# Altium footprint library General.PcbLib: 128 footprints (part 2 of 8)
Each footprint in its own frame and in the unit in brackets; x right, y up, seen from the top. Pads: shape width x height; smd on the part's side, far side on the other; paste and mask are expansions set on the pad; w line width, h text height; cw(c..) or ccw(c..) is an arc to the next point about the centre after c.
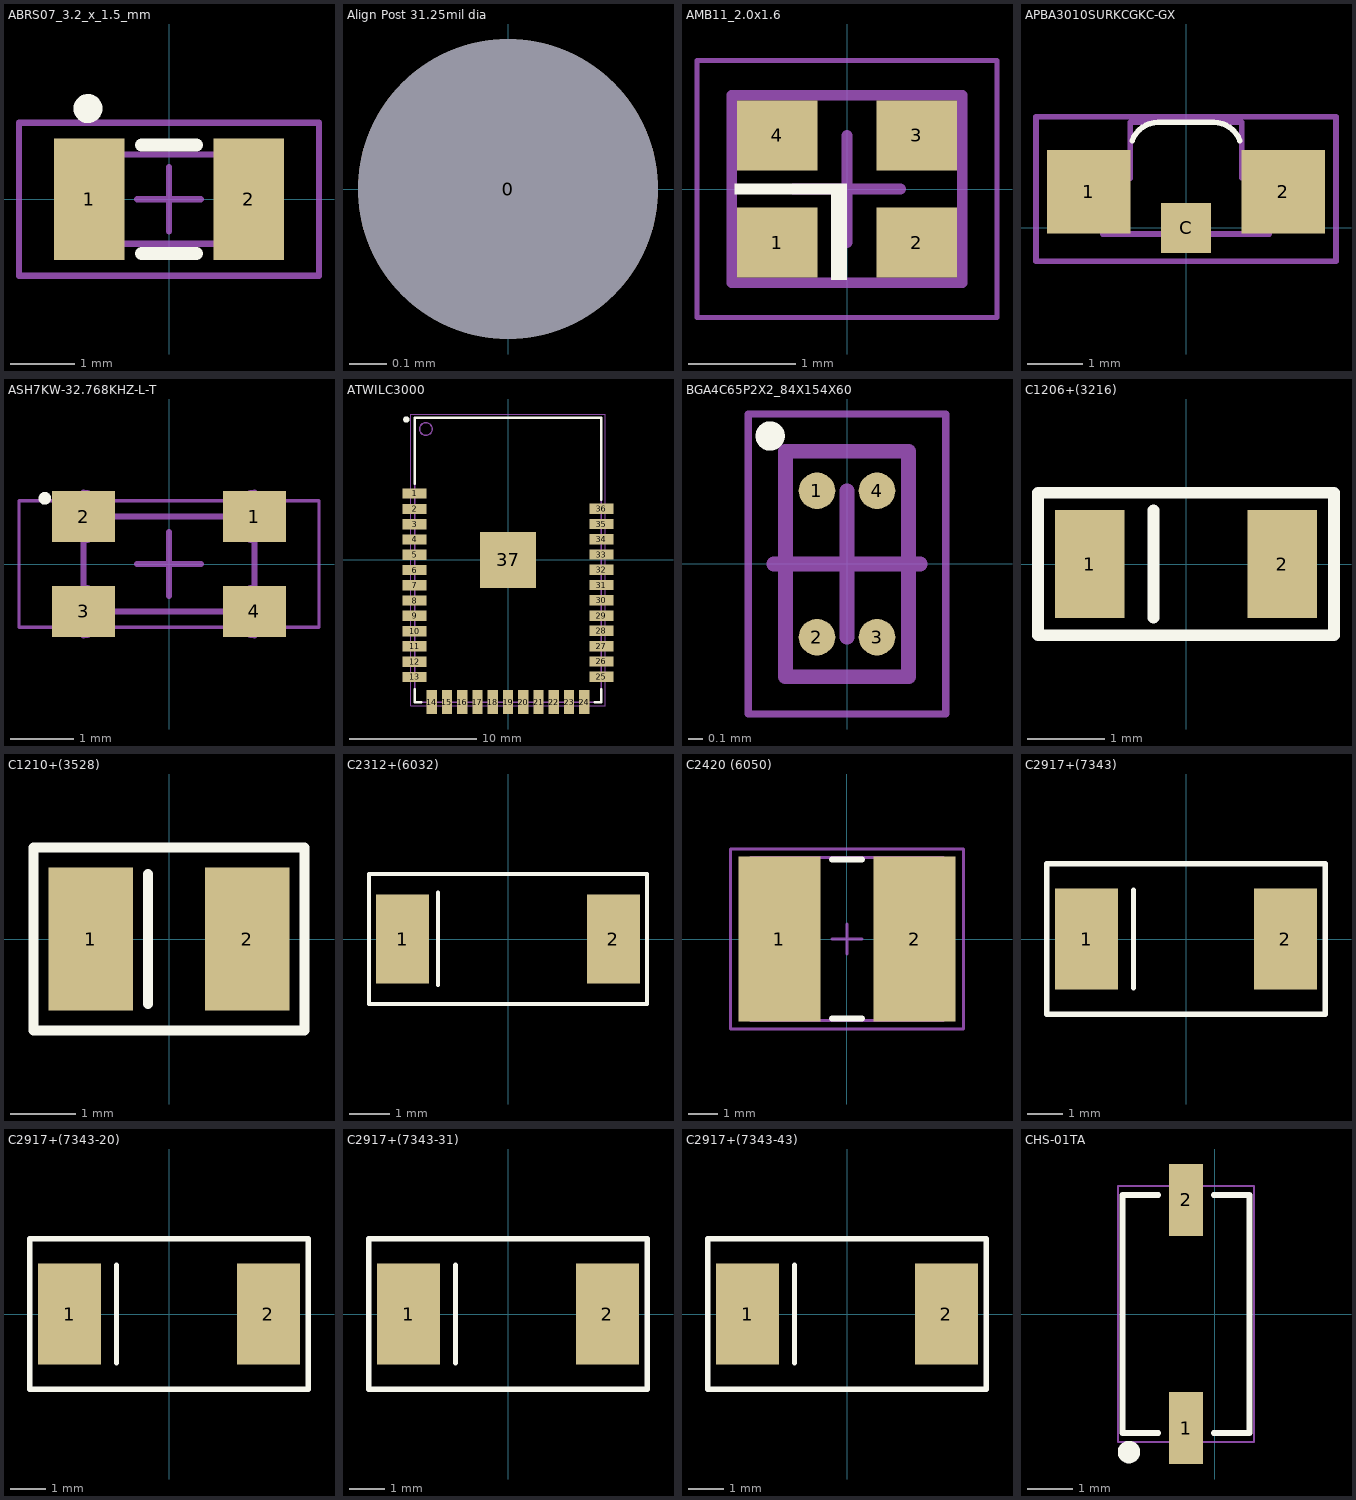
[diagram p1: the footprints below, top view; thin cyan lines are the x and y axes]

## ABRS07_3.2_x_1.5_mm [mm] "Chip Crystal, 2-Leads, Body 3.2x1.3mm, IPC Medium Density"
height 0.9
pads (2):
  rect 1.1x1.9 smd: 1(-1.25,0) 2(1.25,0)
Top Overlay:
  circle w0.254: c-1.269,1.421 r0.1
  lines w0.2: -0.432,-0.851 0.432,-0.851 ; -0.432,0.851 0.432,0.851
Mechanical 13:
  lines w0.1: -1.65,-0.7 1.65,-0.7 1.65,0.7 -1.65,0.7 -1.65,-0.7
Mechanical 15:
  lines w0.1: -0.5,0 0.5,0 ; 0,-0.5 0,0.5 ; -2.35,-1.2 2.35,-1.2 2.35,1.2 -2.35,1.2 -2.35,-1.2
3D body: height 0.9, standoff 0, extent -1.65,-0.7 1.65,0.7

## Align Post 31.25mil dia [mm] "Aignment Post 31.25mil dia."
pads (1):
  round 0.794 hole 0.794 unplated mask+0.102: 0(0,0)
3D body "90145A305_18-8 STAINLESS STEEL DOWEL PIN.STEP": height 0.83, standoff -2.35, extent -0.397,-0.397 0.397,0.397

## AMB11_2.0x1.6 [mm] "QFN, 8-Leads, Body 2.00x1.60mm, Pitch 0.50mm, Thermal Pad 0.15x1.60mm, IPC High Density"
height 0.59
pads (4):
  rect 0.75x0.65 smd: 1(-0.65,-0.5) 2(0.65,-0.5) 3(0.65,0.5) 4(-0.65,0.5)
Top Overlay:
  rectangle: -1.05,-0.05 0,0.05
  rectangle: -0.15,-0.85 0,0
Mechanical 13:
  lines w0.1: -1.075,-0.875 -1.075,0.875 1.075,0.875 1.075,-0.875 -1.075,-0.875
Mechanical 15:
  lines w0.05: -1.4,-1.2 -1.4,1.2 1.4,1.2 1.4,-1.2 -1.4,-1.2
  lines w0.1: -0.5,0 0.5,0 ; 0,-0.5 0,0.5
3D body: height 0.59, standoff 0, extent -1.075,-0.875 1.075,0.875

## APBA3010SURKCGKC-GX [mm] "LED GREEN/RED CLEAR CHIP SMD R/A"
height 1
pads (3):
  rect 1.5x1.5 smd: 1(-1.75,0.65) 2(1.75,0.65)
  rect 0.9x0.9 smd: C(0,0)
Top Overlay:
  lines w0.1: -0.97,1.571 cw(c-0.5,1.4) -0.5,1.9 0.5,1.9 cw(c0.5,1.4) 0.97,1.571
Mechanical 13:
  lines w0.1: -1.5,-0.11 1.5,-0.11 1.5,0.9 1,0.9 1,1.9 -1,1.9 -1,0.895 -1.5,0.895 -1.5,-0.11
Mechanical 15:
  lines w0.1: -2.7,-0.6 -2.7,1.5 -2.7,2 2.7,2 2.7,-0.6 -2.7,-0.6
3D body "APBA3010.STEP": height 1.1, standoff 0.1, extent -1.5,-0.11 1.5,1.9

## ASH7KW-32.768KHZ-L-T [mm] "Chip Array, Concave, 4-Leads, Pitch 1.50mm,  Body 1.50x3.20mm,  IPC Medium Density"
height 1
pads (4):
  rect 1x0.8 smd: 1(1.35,0.75) 2(-1.35,0.75) 3(-1.35,-0.75) 4(1.35,-0.75)
Top Overlay:
  circle w0.1: c-1.962,1.038 r0.05
Mechanical 13:
  lines w0.1: -1.35,-1.125 ccw(c-1.35,-0.75) -1.35,-0.375 -1.35,0.375 ccw(c-1.35,0.75) -1.35,1.125 -1.35,0.75 1.35,0.75 1.35,1.125 ccw(c1.35,0.75) 1.35,0.375 1.35,-0.375 ccw(c1.35,-0.75) 1.35,-1.125 1.35,-0.75 -1.35,-0.75 -1.35,-1.125
Mechanical 15:
  lines w0.05: -2.37,-1 -2.37,1 2.37,1 2.37,-1 -2.37,-1
  lines w0.1: -0.5,0 0.5,0 ; 0,-0.5 0,0.5
3D body "ASH7KW.STEP": height 1, standoff 0, extent -1.6,-0.75 1.6,0.75

## ATWILC3000 [mm] "IEEE 802.11 b/g/n 20MHz (1x1) Wi-Fi plus Bluetooth 5 Low Energy Module"
height 2.09
pads (37):
  rect 1.88x0.813 smd: 1(-7.366,5.235) 2(-7.366,4.014) 3(-7.366,2.81) 4(-7.366,1.606) 5(-7.366,0.402) 6(-7.366,-0.802) 7(-7.366,-2.006) 8(-7.366,-3.21) 9(-7.366,-4.414) 10(-7.366,-5.618) 11(-7.366,-6.822) 12(-7.366,-8.026) 13(-7.366,-9.23) 25(7.366,-9.213) 26(7.366,-8.009) 27(7.366,-6.805) 28(7.366,-5.601) 29(7.366,-4.397) 30(7.366,-3.193) 31(7.366,-1.989) 32(7.366,-0.785) 33(7.366,0.419) 34(7.366,1.623) 35(7.366,2.827) 36(7.366,4.031)
  rect 0.813x1.88 smd: 14(-6.02,-11.214) 15(-4.816,-11.214) 16(-3.612,-11.214) 17(-2.408,-11.214) 18(-1.204,-11.214) 19(0,-11.214) 20(1.204,-11.214) 21(2.408,-11.214) 22(3.612,-11.214) 23(4.816,-11.214) 24(6.02,-11.214)
  rect 4.4x4.4 smd: 37(0,0)
Top Overlay:
  circle w0.25: c-8.02,11.065 r0.125
  lines w0.2: -7.37,-10.215 -7.37,-11.215 -6.826,-11.215 ; -7.37,6 -7.37,11.215 7.33,11.215 ; 6.826,-11.215 7.37,-11.215 7.37,-10.215 ; 6.826,11.215 7.37,11.215 7.37,4.75
Mechanical 13:
  circle w0.1: c-6.47,10.315 r0.5
  lines w0.1: -7.37,-11.215 -7.37,11.215 7.37,11.215 7.37,-11.215 -7.37,-11.215
Mechanical 15:
  lines w0.05: -7.65,-11.5 -7.65,11.5 7.65,11.5 7.65,-11.5 -7.65,-11.5
  lines w0.1: -0.5,0 0.5,0 ; 0,-0.5 0,0.5
3D body "734120110.stp": height 2.09, standoff 0.79, extent -6.29,6.75 -3.21,9.75
3D body: height 2.09, standoff 0.79, extent -6.5,-9.982 6.5,4.25
3D body: height 0.79, standoff 0, extent -7.37,-11.215 7.37,11.215

## BGA4C65P2X2_84X154X60 [mm] "BGA, 4-Leads, Body 0.84x1.54mmx0.60mm, Pitch 0.65mm"
height 0.6
pads (4):
  round 0.25 smd: 1(-0.205,0.5) 2(-0.205,-0.5) 3(0.205,-0.5) 4(0.205,0.5)
Top Overlay:
  circle w0.1: c-0.525,0.875 r0.05
Mechanical 13:
  lines w0.1: -0.42,-0.77 0.42,-0.77 0.42,0.77 -0.42,0.77 -0.42,-0.77
Mechanical 15:
  lines w0.05: -0.675,-1.025 0.675,-1.025 0.675,1.025 -0.675,1.025 -0.675,-1.025
  lines w0.1: -0.5,0 0.5,0 ; 0,-0.5 0,0.5
3D body: height 0.6, standoff 0.16, extent -0.42,-0.77 0.42,0.77

## C1206+(3216) [mm] "EIA-A"
pads (2):
  rect 0.9x1.4 smd: 1(-1.25,0) 2(1.25,0)
Top Overlay:
  lines w0.152: -0.423,-0.7 -0.423,0.7 ; -1.925,-0.925 1.925,-0.925 1.925,0.925 -1.925,0.925 -1.925,-0.925
3D body "User Library-cap3216h160.step": height 1.6, standoff 0, extent -1.6,-0.8 1.6,0.8

## C1210+(3528) [mm] "EIA-C"
pads (2):
  rect 1.3x2.2 smd: 1(-1.2,0) 2(1.2,0)
Top Overlay:
  lines w0.152: -0.325,-1 -0.325,1 ; -2.075,-1.4 2.075,-1.4 2.075,1.4 -2.075,1.4 -2.075,-1.4
3D body: height 1.9, standoff 0, extent -1.75,-1.4 1.75,1.4

## C2312+(6032) [mm] "EIA-C"
pads (2):
  rect 1.3x2.2 smd: 1(-2.6,0) 2(2.6,0)
Top Overlay:
  lines w0.1: -3.425,1.6 3.425,1.6 3.425,-1.6 ; -1.724,-1.135 -1.724,1.143
  lines w0.102: -3.425,1.6 -3.425,-1.6 3.425,-1.6
3D body "User Library-cap_c.step": height 2.51, standoff 0, extent -2.997,-1.55 2.997,1.65

## C2420 (6050) [mm] "Chip Capacitor, 2-Leads, Body 6.0x5.0mm, IPC Medium Density"
height 3.5
pads (2):
  rect 2.75x5.55 smd: 1(-2.275,0) 2(2.275,0)
Top Overlay:
  lines w0.2: -0.5,-2.675 0.5,-2.675 ; -0.5,2.675 0.5,2.675
Mechanical 13:
  lines w0.1: -3.25,-2.75 -3.25,2.75 3.25,2.75 3.25,-2.75 -3.25,-2.75
Mechanical 15:
  lines w0.1: -0.5,0 0.5,0 ; 0,-0.5 0,0.5 ; -3.925,-3.025 -3.925,3.025 3.925,3.025 3.925,-3.025 -3.925,-3.025
3D body: height 3.5, standoff 0, extent -3.25,-2.75 3.25,2.75

## C2917+(7343) [mil]
pads (2):
  rect 71x114 smd: 1(-112,0) 2(112,0)
Top Overlay:
  lines w6: -59.06,-55.12 -59.06,55.12 ; -157,-84.65 -157,84.65 157,84.65 157,-84.65 -157,-84.65
3D body "SW3dPS-tantulum cap 7343.STEP": height 88.4, standoff 0.6, extent -143.69,-84.64 143.71,84.65

## C2917+(7343-20) [mil]
pads (2):
  rect 71x114 smd: 1(-112,0) 2(112,0)
Top Overlay:
  lines w6: -59.06,-55.12 -59.06,55.12 ; -157,-84.65 -157,84.65 157,84.65 157,-84.65 -157,-84.65
3D body "SW3dPS-tantulum cap 7343.STEP": height 88.4, standoff 0.6, extent -143.69,-84.64 143.71,84.65

## C2917+(7343-31) [mil]
pads (2):
  rect 71x114 smd: 1(-112,0) 2(112,0)
Top Overlay:
  lines w6: -59.06,-55.12 -59.06,55.12 ; -157,-84.65 157,-84.65 157,84.65 -157,84.65 -157,-84.65
3D body "CAP_TANT_7343-31.step": height 122.05, standoff 0, extent -149.6,-90.55 149.62,90.56

## C2917+(7343-43) [mil]
pads (2):
  rect 71x114 smd: 1(-112,0) 2(112,0)
Top Overlay:
  lines w6: -59.06,-55.12 -59.06,55.12 ; -157,-84.65 -157,84.65 157,84.65 157,-84.65 -157,-84.65
3D body: height 157, standoff 0, extent -144.5,-84 142.5,85

## CHS-01TA [mm]
pads (2):
  rect 0.76x1.6 smd: 1(-0.635,-2.54) 2(-0.635,2.54)
Top Overlay:
  circle w0.25: c-1.905,-3.075 r0.125
  lines w0.127: -1.25,-2.65 -2.05,-2.65 -2.05,2.65 -1.25,2.65 ; -0.02,-2.65 0.78,-2.65 0.78,2.65 -0.02,2.65
Mechanical 15:
  lines w0.05: -2.15,-2.85 -2.15,2.85 0.88,2.85 0.88,-2.85 -2.15,-2.85
3D body "CHS-01TA.stp": height 2.52, standoff 0, extent -1.885,-2.8 0.615,2.8